# Altium schematic symbol library TI Amplifiers and Linear Operational Amplifier High Speed.SchLib: 1100 symbols (part 23 of 25)
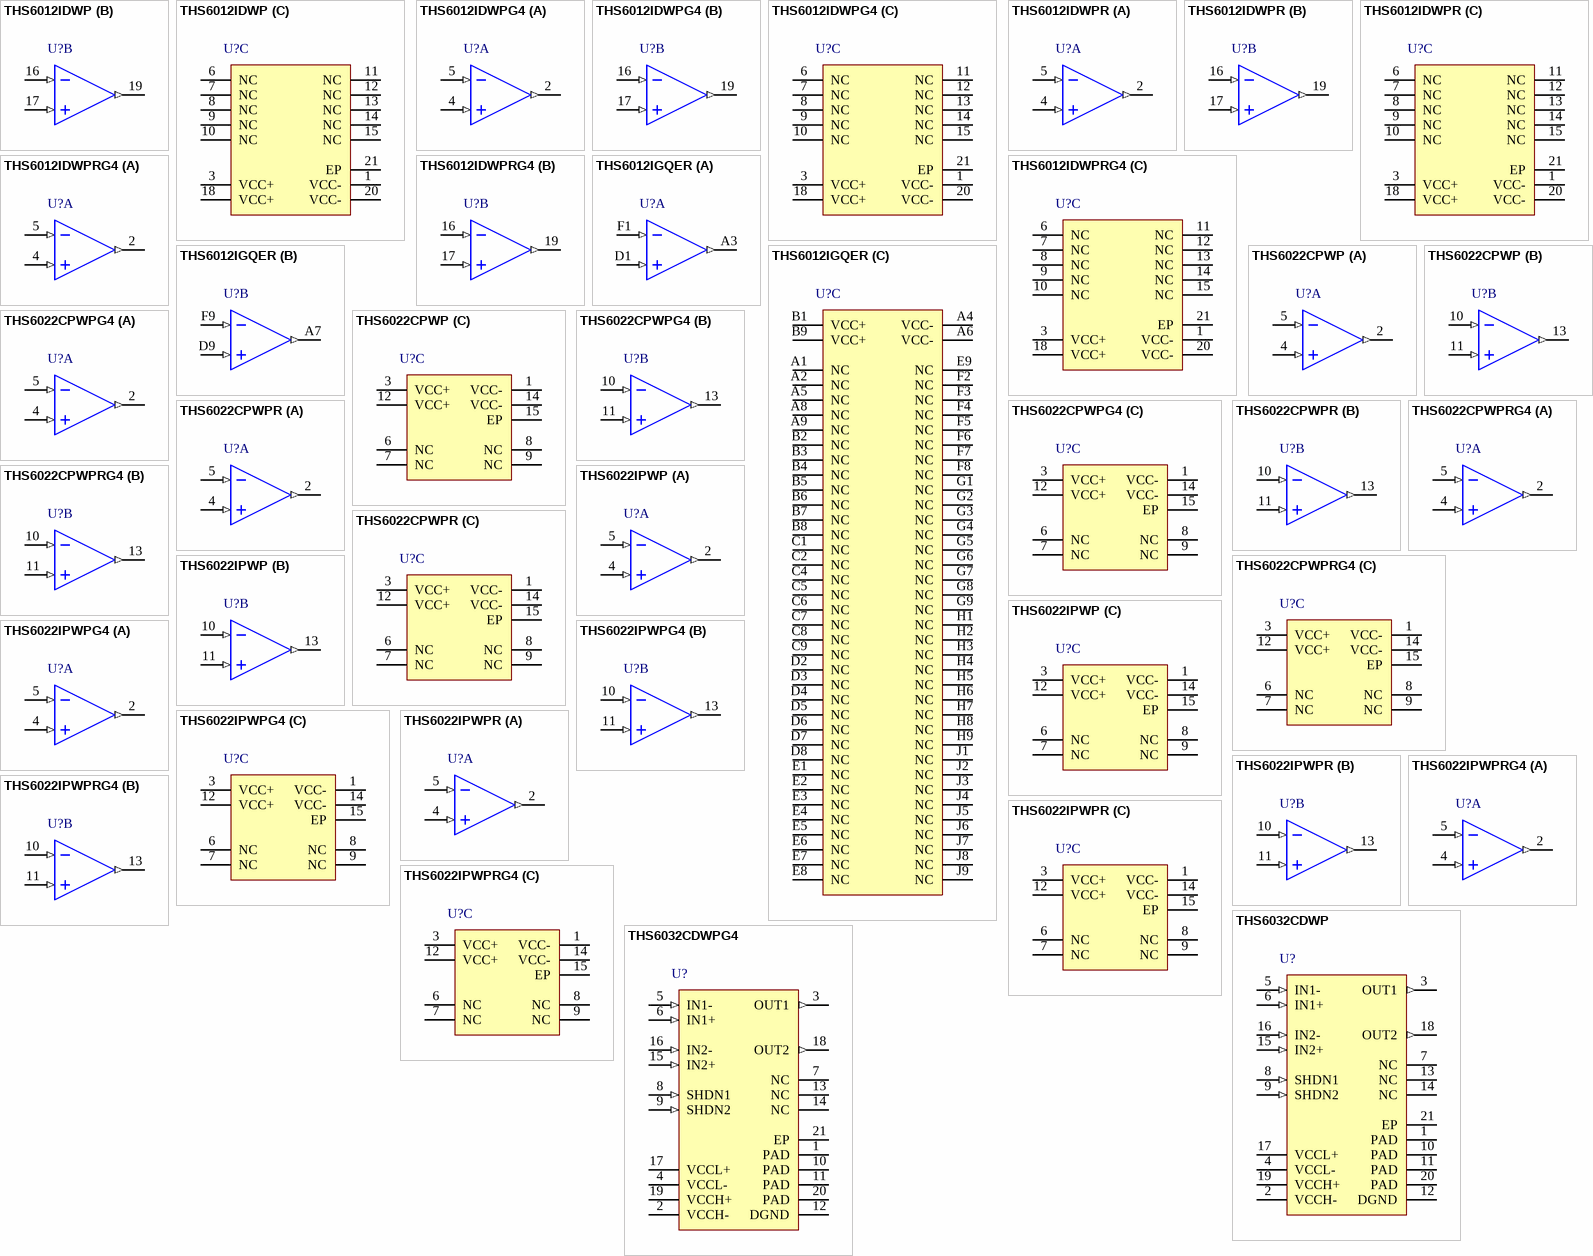
[diagram p73: symbols THS6012IDWP to THS6032CDWPG4]

## THS6022IPWPG4
designator U?
250 mA Dual Differential Line Driver, 9 to 32 V, -40 to 85 degC, 14-pin SOP (PWP14), Green (RoHS & no Sb/Br); Manufacturer: Texas Instruments; PartNumber: THS6022IPWPG4; 2nd Harmonic(dBc): 76; 3rd Harmonic(dBc): 80; @ MHz: 1; BW @ Acl(MHz): 210; Diff Gain(%): 0.04; Diff Phase(deg): 0.06; Iib(Max)(nA): 12000; Io(Typ)(mA): 250; Iq per channel(Max)(mA): 10; Number of Channels: 2; Settling Time (0.1%)(Typ)(ns): 70; Slew Rate(Typ)(V/us): 1900; Sub Family: High Output Current Amplifier (>=50mA), High Speed Amplifier (>=50MHz), High Supply Voltage Amplifier (>=30V); THD (Fc is 1 MHz)(Typ)(dB): -66; Vio(Max)(mV): 4; Vn at Flatband(Typ)(nV/rtHz): 1.7; Vs(Max)(V): 32; Vs(Min)(V): 9; DatasheetVersion: SLOS225D; PackageVersion: 4073225-2/I, 05/2011; PackageReference: PWP14-1830X2055TP; PackageDescription: 14-Pin Plastic Small Outline, Body 4.4 x 5 mm, Pitch 0.65 mm; Supplier 1: Digi-Key; Supplier Part Number 1: THS6022IPWPG4-ND; Supplier 2: Newark; Supplier Part Number 2: 14M2289; Supplier 3: Mouser; Supplier Part Number 3: 595-THS6022IPWPG4; Acl, min stable gain(V/V): 1; Eco-Plan: Green (RoHS & no Sb/Br); Mounting Technology: Surface Mount; Code_JEDEC: MO-153; ComponentLink1Description: Manufacturer URL; ComponentLink1URL: http://www.ti.com/; ComponentLink2Description: Datasheet; ComponentLink2URL: http://www.ti.com/general/docs/lit/getliterature.tsp?genericPartNumber=THS6022&fileType=pdf; ComponentLink3Description: Package Specification; ComponentLink3URL: http://www.ti.com/litv/pdf/mpds373
footprint TI-PWP14-1830X2055TP_N (SOP, 14-Leads, Body 5x4.4mm, Pitch 0.65mm, Thermal Pad 1.830x2.055mm, IPC Medium Density)
footprint TI-PWP14-1830X2055TP_L (SOP, 14-Leads, Body 5x4.4mm, Pitch 0.65mm, Thermal Pad 1.830x2.055mm, IPC High Density)
footprint TI-PWP14-1830X2055TP_M (SOP, 14-Leads, Body 5x4.4mm, Pitch 0.65mm, Thermal Pad 1.830x2.055mm, IPC Low Density)
part A pins: 2 OUT1 (out), 4 IN1+ (in), 5 IN1- (in)
part B pins: 10 IN2- (in), 11 IN2+ (in), 13 OUT2 (out)
part C pins: 1 VCC- (power), 3 VCC+ (power), 6 NC, 7 NC, 8 NC, 9 NC, 12 VCC+ (power), 14 VCC- (power), 15 EP

## THS6022IPWPR
designator U?
250 mA Dual Differential Line Driver, 9 to 32 V, -40 to 85 degC, 14-pin SOP (PWP14), Green (RoHS & no Sb/Br); Manufacturer: Texas Instruments; PartNumber: THS6022IPWPR; 2nd Harmonic(dBc): 76; 3rd Harmonic(dBc): 80; @ MHz: 1; BW @ Acl(MHz): 210; Diff Gain(%): 0.04; Diff Phase(deg): 0.06; Iib(Max)(nA): 12000; Io(Typ)(mA): 250; Iq per channel(Max)(mA): 10; Number of Channels: 2; Settling Time (0.1%)(Typ)(ns): 70; Slew Rate(Typ)(V/us): 1900; Sub Family: High Output Current Amplifier (>=50mA), High Speed Amplifier (>=50MHz), High Supply Voltage Amplifier (>=30V); THD (Fc is 1 MHz)(Typ)(dB): -66; Vio(Max)(mV): 4; Vn at Flatband(Typ)(nV/rtHz): 1.7; Vs(Max)(V): 32; Vs(Min)(V): 9; DatasheetVersion: SLOS225D; PackageVersion: 4073225-2/I, 05/2011; PackageReference: PWP14-1830X2055TP; PackageDescription: 14-Pin Plastic Small Outline, Body 4.4 x 5 mm, Pitch 0.65 mm; Supplier 1: Digi-Key; Supplier Part Number 1: THS6022IPWPR-ND; Supplier 2: Mouser; Supplier Part Number 2: 595-THS6022IPWPR; Acl, min stable gain(V/V): 1; Eco-Plan: Green (RoHS & no Sb/Br); Mounting Technology: Surface Mount; Code_JEDEC: MO-153; ComponentLink1Description: Manufacturer URL; ComponentLink1URL: http://www.ti.com/; ComponentLink2Description: Datasheet; ComponentLink2URL: http://www.ti.com/general/docs/lit/getliterature.tsp?genericPartNumber=THS6022&fileType=pdf; ComponentLink3Description: Package Specification; ComponentLink3URL: http://www.ti.com/litv/pdf/mpds373
footprint TI-PWP14-1830X2055TP_N (SOP, 14-Leads, Body 5x4.4mm, Pitch 0.65mm, Thermal Pad 1.830x2.055mm, IPC Medium Density)
footprint TI-PWP14-1830X2055TP_L (SOP, 14-Leads, Body 5x4.4mm, Pitch 0.65mm, Thermal Pad 1.830x2.055mm, IPC High Density)
footprint TI-PWP14-1830X2055TP_M (SOP, 14-Leads, Body 5x4.4mm, Pitch 0.65mm, Thermal Pad 1.830x2.055mm, IPC Low Density)
part A pins: 2 OUT1 (out), 4 IN1+ (in), 5 IN1- (in)
part B pins: 10 IN2- (in), 11 IN2+ (in), 13 OUT2 (out)
part C pins: 1 VCC- (power), 3 VCC+ (power), 6 NC, 7 NC, 8 NC, 9 NC, 12 VCC+ (power), 14 VCC- (power), 15 EP

## THS6022IPWPRG4
designator U?
250 mA Dual Differential Line Driver, 9 to 32 V, -40 to 85 degC, 14-pin SOP (PWP14), Green (RoHS & no Sb/Br); Manufacturer: Texas Instruments; PartNumber: THS6022IPWPRG4; 2nd Harmonic(dBc): 76; 3rd Harmonic(dBc): 80; @ MHz: 1; BW @ Acl(MHz): 210; Diff Gain(%): 0.04; Diff Phase(deg): 0.06; Iib(Max)(nA): 12000; Io(Typ)(mA): 250; Iq per channel(Max)(mA): 10; Number of Channels: 2; Settling Time (0.1%)(Typ)(ns): 70; Slew Rate(Typ)(V/us): 1900; Sub Family: High Output Current Amplifier (>=50mA), High Speed Amplifier (>=50MHz), High Supply Voltage Amplifier (>=30V); THD (Fc is 1 MHz)(Typ)(dB): -66; Vio(Max)(mV): 4; Vn at Flatband(Typ)(nV/rtHz): 1.7; Vs(Max)(V): 32; Vs(Min)(V): 9; DatasheetVersion: SLOS225D; PackageVersion: 4073225-2/I, 05/2011; PackageReference: PWP14-1830X2055TP; PackageDescription: 14-Pin Plastic Small Outline, Body 4.4 x 5 mm, Pitch 0.65 mm; Supplier 1: Digi-Key; Supplier Part Number 1: THS6022IPWPRG4-ND; Supplier 2: Mouser; Supplier Part Number 2: 595-THS6022IPWPRG4; Acl, min stable gain(V/V): 1; Eco-Plan: Green (RoHS & no Sb/Br); Mounting Technology: Surface Mount; Code_JEDEC: MO-153; ComponentLink1Description: Manufacturer URL; ComponentLink1URL: http://www.ti.com/; ComponentLink2Description: Datasheet; ComponentLink2URL: http://www.ti.com/general/docs/lit/getliterature.tsp?genericPartNumber=THS6022&fileType=pdf; ComponentLink3Description: Package Specification; ComponentLink3URL: http://www.ti.com/litv/pdf/mpds373
footprint TI-PWP14-1830X2055TP_N (SOP, 14-Leads, Body 5x4.4mm, Pitch 0.65mm, Thermal Pad 1.830x2.055mm, IPC Medium Density)
footprint TI-PWP14-1830X2055TP_L (SOP, 14-Leads, Body 5x4.4mm, Pitch 0.65mm, Thermal Pad 1.830x2.055mm, IPC High Density)
footprint TI-PWP14-1830X2055TP_M (SOP, 14-Leads, Body 5x4.4mm, Pitch 0.65mm, Thermal Pad 1.830x2.055mm, IPC Low Density)
part A pins: 2 OUT1 (out), 4 IN1+ (in), 5 IN1- (in)
part B pins: 10 IN2- (in), 11 IN2+ (in), 13 OUT2 (out)
part C pins: 1 VCC- (power), 3 VCC+ (power), 6 NC, 7 NC, 8 NC, 9 NC, 12 VCC+ (power), 14 VCC- (power), 15 EP

## THS6032CDWP
designator U?
Low-Power ADSL Central Office Line Driver, 6 to 32 V, 0 to 70 degC, 20-pin SOP (DWP20), Green (RoHS & no Sb/Br); Manufacturer: Texas Instruments; PartNumber: THS6032CDWP; 2nd Harmonic(dBc): 79; 3rd Harmonic(dBc): 68; @ MHz: 1; BW @ Acl(MHz): 100; Diff Gain(%): 0.016; Diff Phase(deg): 0.4; Iib(Max)(nA): 12000; Io(Typ)(mA): 440; Number of Channels: 2; Settling Time (0.1%)(Typ)(ns): 120; Slew Rate(Typ)(V/us): 1200; Sub Family: High Output Current Amplifier (>=50mA), High Speed Amplifier (>=50MHz), High Supply Voltage Amplifier (>=30V); THD (Fc is 1 MHz)(Typ)(dB): -62; Vio(Max)(mV): 5; Vn at Flatband(Typ)(nV/rtHz): 2.4; Vs(Max)(V): 32; Vs(Min)(V): 6; DatasheetVersion: SLOS233F; PackageVersion: 4147575/C, 02/2005; PackageReference: DWP20-3905X3265TP; PackageDescription: 20-Pin PowerPAD(TM) Plastic Small-Outline Package, Body 12.825 x 7.52 mm, Pitch 1.27 mm; Supplier 1: Digi-Key; Supplier Part Number 1: 296-2373-5-ND; Supplier 2: Newark; Supplier Part Number 2: 76C6521; Supplier 3: Mouser; Supplier Part Number 3: 595-THS6032CDWP; Acl, min stable gain(V/V): 1; Eco-Plan: Green (RoHS & no Sb/Br); Mounting Technology: Surface Mount; ComponentLink1Description: Manufacturer URL; ComponentLink1URL: http://www.ti.com/; ComponentLink2Description: Datasheet; ComponentLink2URL: http://www.ti.com/general/docs/lit/getliterature.tsp?genericPartNumber=THS6032&fileType=pdf; ComponentLink3Description: Package Specification; ComponentLink3URL: http://www.ti.com/litv/pdf/mpds032b
footprint TI-DWP20-3905X3265TP_N (SOP, 20-Leads, Body 12.83x7.52mm, Pitch 1.27mm, Thermal Pad 3.27x3.91mm, IPC Medium Density)
footprint TI-DWP20-3905X3265TP_L (SOP, 20-Leads, Body 12.83x7.52mm, Pitch 1.27mm, Thermal Pad 3.27x3.91mm, IPC High Density)
footprint TI-DWP20-3905X3265TP_M (SOP, 20-Leads, Body 12.83x7.52mm, Pitch 1.27mm, Thermal Pad 3.27x3.91mm, IPC Low Density)
pins: 1 PAD (power), 2 VCCH- (power), 3 OUT1 (out), 4 VCCL- (power), 5 IN1- (in), 6 IN1+ (in), 7 NC, 8 SHDN1 (in), 9 SHDN2 (in), 10 PAD (power), 11 PAD (power), 12 DGND (power), 13 NC, 14 NC, 15 IN2+ (in), 16 IN2- (in), 17 VCCL+ (power), 18 OUT2 (out), 19 VCCH+ (power), 20 PAD (power), 21 EP (power)

## THS6032CDWPG4
designator U?
Low-Power ADSL Central Office Line Driver, 6 to 32 V, 0 to 70 degC, 20-pin SOP (DWP20), Green (RoHS & no Sb/Br); Manufacturer: Texas Instruments; PartNumber: THS6032CDWPG4; 2nd Harmonic(dBc): 79; 3rd Harmonic(dBc): 68; @ MHz: 1; BW @ Acl(MHz): 100; Diff Gain(%): 0.016; Diff Phase(deg): 0.4; Iib(Max)(nA): 12000; Io(Typ)(mA): 440; Number of Channels: 2; Settling Time (0.1%)(Typ)(ns): 120; Slew Rate(Typ)(V/us): 1200; Sub Family: High Output Current Amplifier (>=50mA), High Speed Amplifier (>=50MHz), High Supply Voltage Amplifier (>=30V); THD (Fc is 1 MHz)(Typ)(dB): -62; Vio(Max)(mV): 5; Vn at Flatband(Typ)(nV/rtHz): 2.4; Vs(Max)(V): 32; Vs(Min)(V): 6; DatasheetVersion: SLOS233F; PackageVersion: 4147575/C, 02/2005; PackageReference: DWP20-3905X3265TP; PackageDescription: 20-Pin PowerPAD(TM) Plastic Small-Outline Package, Body 12.825 x 7.52 mm, Pitch 1.27 mm; Supplier 1: Digi-Key; Supplier Part Number 1: THS6032CDWPG4-ND; Supplier 2: Mouser; Supplier Part Number 2: 595-THS6032CDWPG4; Acl, min stable gain(V/V): 1; Eco-Plan: Green (RoHS & no Sb/Br); Mounting Technology: Surface Mount; ComponentLink1Description: Manufacturer URL; ComponentLink1URL: http://www.ti.com/; ComponentLink2Description: Datasheet; ComponentLink2URL: http://www.ti.com/general/docs/lit/getliterature.tsp?genericPartNumber=THS6032&fileType=pdf; ComponentLink3Description: Package Specification; ComponentLink3URL: http://www.ti.com/litv/pdf/mpds032b
footprint TI-DWP20-3905X3265TP_N (SOP, 20-Leads, Body 12.83x7.52mm, Pitch 1.27mm, Thermal Pad 3.27x3.91mm, IPC Medium Density)
footprint TI-DWP20-3905X3265TP_L (SOP, 20-Leads, Body 12.83x7.52mm, Pitch 1.27mm, Thermal Pad 3.27x3.91mm, IPC High Density)
footprint TI-DWP20-3905X3265TP_M (SOP, 20-Leads, Body 12.83x7.52mm, Pitch 1.27mm, Thermal Pad 3.27x3.91mm, IPC Low Density)
pins: 1 PAD (power), 2 VCCH- (power), 3 OUT1 (out), 4 VCCL- (power), 5 IN1- (in), 6 IN1+ (in), 7 NC, 8 SHDN1 (in), 9 SHDN2 (in), 10 PAD (power), 11 PAD (power), 12 DGND (power), 13 NC, 14 NC, 15 IN2+ (in), 16 IN2- (in), 17 VCCL+ (power), 18 OUT2 (out), 19 VCCH+ (power), 20 PAD (power), 21 EP (power)

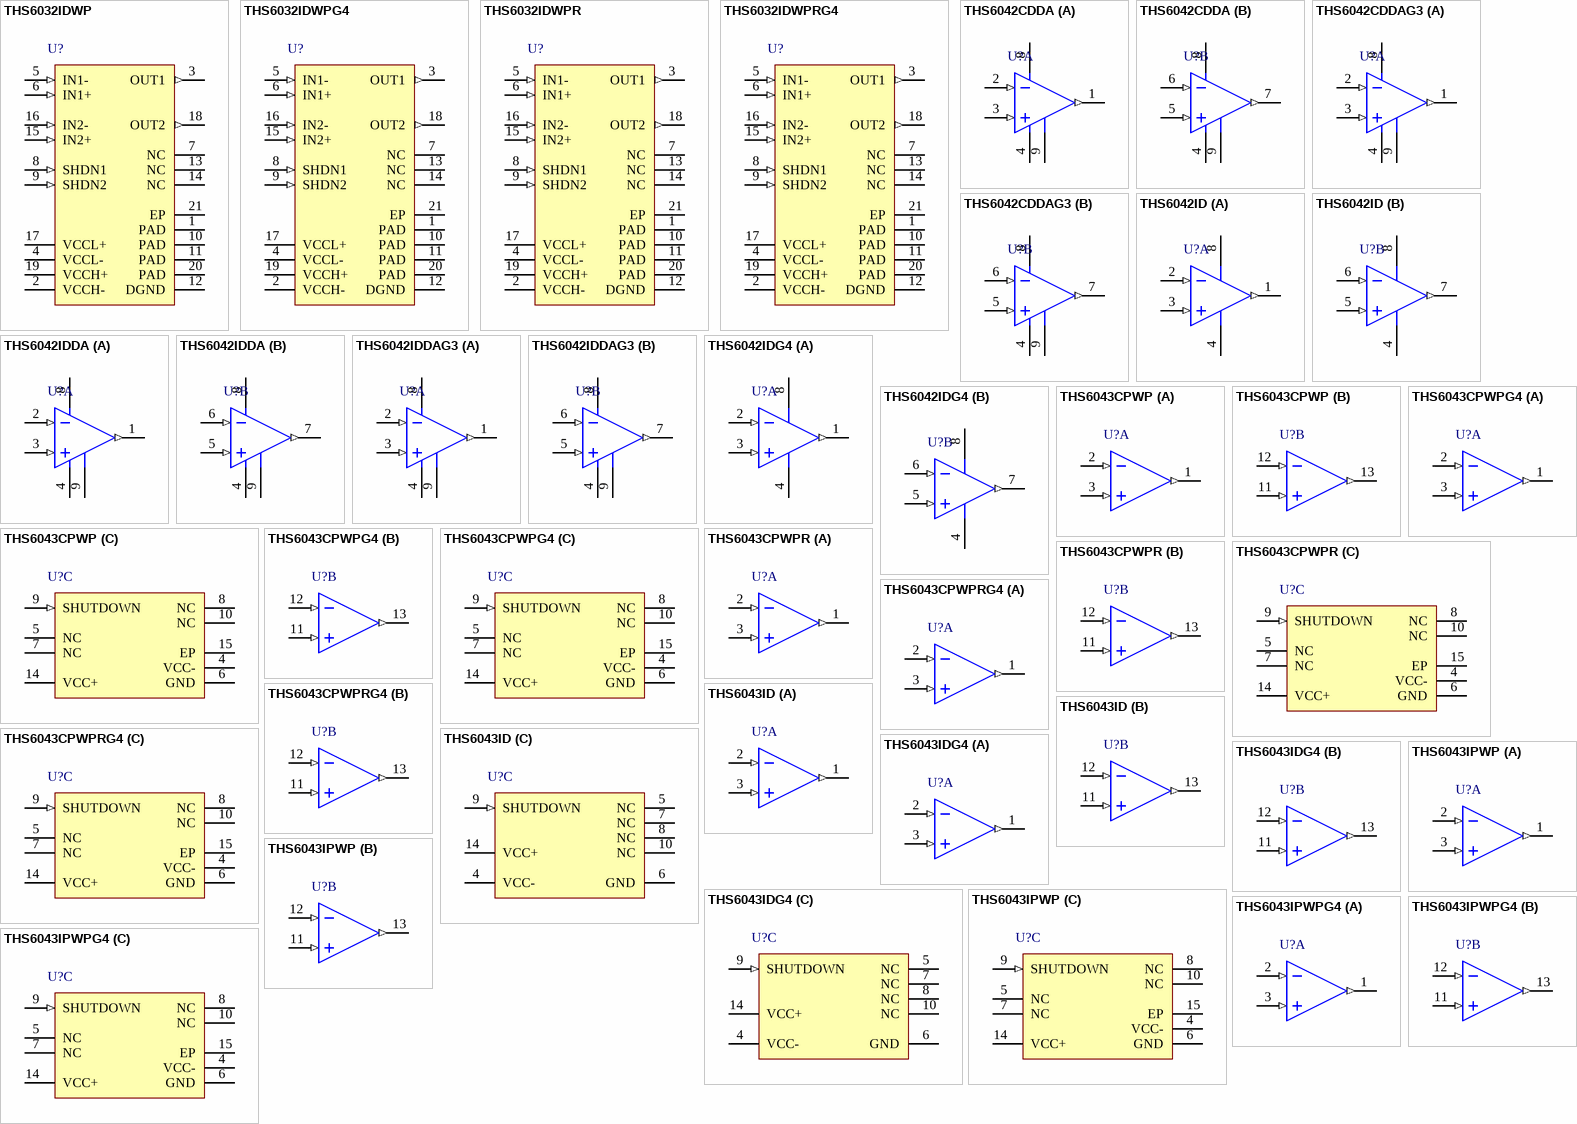
[diagram p46: symbols THS6032IDWP to THS6043IPWPG4]

## THS6032IDWP
designator U?
Low-Power ADSL Central Office Line Driver, 6 to 32 V, -40 to 85 degC, 20-pin SOP (DWP20), Green (RoHS & no Sb/Br); Manufacturer: Texas Instruments; PartNumber: THS6032IDWP; 2nd Harmonic(dBc): 79; 3rd Harmonic(dBc): 68; @ MHz: 1; BW @ Acl(MHz): 100; Diff Gain(%): 0.016; Diff Phase(deg): 0.4; Iib(Max)(nA): 12000; Io(Typ)(mA): 440; Number of Channels: 2; Settling Time (0.1%)(Typ)(ns): 120; Slew Rate(Typ)(V/us): 1200; Sub Family: High Output Current Amplifier (>=50mA), High Speed Amplifier (>=50MHz), High Supply Voltage Amplifier (>=30V); THD (Fc is 1 MHz)(Typ)(dB): -62; Vio(Max)(mV): 5; Vn at Flatband(Typ)(nV/rtHz): 2.4; Vs(Max)(V): 32; Vs(Min)(V): 6; DatasheetVersion: SLOS233F; PackageVersion: 4147575/C, 02/2005; PackageReference: DWP20-3905X3265TP; PackageDescription: 20-Pin PowerPAD(TM) Plastic Small-Outline Package, Body 12.825 x 7.52 mm, Pitch 1.27 mm; Supplier 1: Digi-Key; Supplier Part Number 1: 296-10065-5-ND; Supplier 2: Newark; Supplier Part Number 2: 76C6527; Supplier 3: Mouser; Supplier Part Number 3: 595-THS6032IDWP; Acl, min stable gain(V/V): 1; Eco-Plan: Green (RoHS & no Sb/Br); Mounting Technology: Surface Mount; ComponentLink1Description: Manufacturer URL; ComponentLink1URL: http://www.ti.com/; ComponentLink2Description: Datasheet; ComponentLink2URL: http://www.ti.com/general/docs/lit/getliterature.tsp?genericPartNumber=THS6032&fileType=pdf; ComponentLink3Description: Package Specification; ComponentLink3URL: http://www.ti.com/litv/pdf/mpds032b
footprint TI-DWP20-3905X3265TP_N (SOP, 20-Leads, Body 12.83x7.52mm, Pitch 1.27mm, Thermal Pad 3.27x3.91mm, IPC Medium Density)
footprint TI-DWP20-3905X3265TP_L (SOP, 20-Leads, Body 12.83x7.52mm, Pitch 1.27mm, Thermal Pad 3.27x3.91mm, IPC High Density)
footprint TI-DWP20-3905X3265TP_M (SOP, 20-Leads, Body 12.83x7.52mm, Pitch 1.27mm, Thermal Pad 3.27x3.91mm, IPC Low Density)
pins: 1 PAD (power), 2 VCCH- (power), 3 OUT1 (out), 4 VCCL- (power), 5 IN1- (in), 6 IN1+ (in), 7 NC, 8 SHDN1 (in), 9 SHDN2 (in), 10 PAD (power), 11 PAD (power), 12 DGND (power), 13 NC, 14 NC, 15 IN2+ (in), 16 IN2- (in), 17 VCCL+ (power), 18 OUT2 (out), 19 VCCH+ (power), 20 PAD (power), 21 EP (power)

## THS6032IDWPG4
designator U?
Low-Power ADSL Central Office Line Driver, 6 to 32 V, -40 to 85 degC, 20-pin SOP (DWP20), Green (RoHS & no Sb/Br); Manufacturer: Texas Instruments; PartNumber: THS6032IDWPG4; 2nd Harmonic(dBc): 79; 3rd Harmonic(dBc): 68; @ MHz: 1; BW @ Acl(MHz): 100; Diff Gain(%): 0.016; Diff Phase(deg): 0.4; Iib(Max)(nA): 12000; Io(Typ)(mA): 440; Number of Channels: 2; Settling Time (0.1%)(Typ)(ns): 120; Slew Rate(Typ)(V/us): 1200; Sub Family: High Output Current Amplifier (>=50mA), High Speed Amplifier (>=50MHz), High Supply Voltage Amplifier (>=30V); THD (Fc is 1 MHz)(Typ)(dB): -62; Vio(Max)(mV): 5; Vn at Flatband(Typ)(nV/rtHz): 2.4; Vs(Max)(V): 32; Vs(Min)(V): 6; DatasheetVersion: SLOS233F; PackageVersion: 4147575/C, 02/2005; PackageReference: DWP20-3905X3265TP; PackageDescription: 20-Pin PowerPAD(TM) Plastic Small-Outline Package, Body 12.825 x 7.52 mm, Pitch 1.27 mm; Supplier 1: Digi-Key; Supplier Part Number 1: THS6032IDWPG4-ND; Supplier 2: Mouser; Supplier Part Number 2: 595-THS6032IDWPG4; Acl, min stable gain(V/V): 1; Eco-Plan: Green (RoHS & no Sb/Br); Mounting Technology: Surface Mount; ComponentLink1Description: Manufacturer URL; ComponentLink1URL: http://www.ti.com/; ComponentLink2Description: Datasheet; ComponentLink2URL: http://www.ti.com/general/docs/lit/getliterature.tsp?genericPartNumber=THS6032&fileType=pdf; ComponentLink3Description: Package Specification; ComponentLink3URL: http://www.ti.com/litv/pdf/mpds032b
footprint TI-DWP20-3905X3265TP_N (SOP, 20-Leads, Body 12.83x7.52mm, Pitch 1.27mm, Thermal Pad 3.27x3.91mm, IPC Medium Density)
footprint TI-DWP20-3905X3265TP_L (SOP, 20-Leads, Body 12.83x7.52mm, Pitch 1.27mm, Thermal Pad 3.27x3.91mm, IPC High Density)
footprint TI-DWP20-3905X3265TP_M (SOP, 20-Leads, Body 12.83x7.52mm, Pitch 1.27mm, Thermal Pad 3.27x3.91mm, IPC Low Density)
pins: 1 PAD (power), 2 VCCH- (power), 3 OUT1 (out), 4 VCCL- (power), 5 IN1- (in), 6 IN1+ (in), 7 NC, 8 SHDN1 (in), 9 SHDN2 (in), 10 PAD (power), 11 PAD (power), 12 DGND (power), 13 NC, 14 NC, 15 IN2+ (in), 16 IN2- (in), 17 VCCL+ (power), 18 OUT2 (out), 19 VCCH+ (power), 20 PAD (power), 21 EP (power)

## THS6032IDWPR
designator U?
Low-Power ADSL Central Office Line Driver, 6 to 32 V, -40 to 85 degC, 20-pin SOP (DWP20), Green (RoHS & no Sb/Br); Manufacturer: Texas Instruments; PartNumber: THS6032IDWPR; 2nd Harmonic(dBc): 79; 3rd Harmonic(dBc): 68; @ MHz: 1; BW @ Acl(MHz): 100; Diff Gain(%): 0.016; Diff Phase(deg): 0.4; Iib(Max)(nA): 12000; Io(Typ)(mA): 440; Number of Channels: 2; Settling Time (0.1%)(Typ)(ns): 120; Slew Rate(Typ)(V/us): 1200; Sub Family: High Output Current Amplifier (>=50mA), High Speed Amplifier (>=50MHz), High Supply Voltage Amplifier (>=30V); THD (Fc is 1 MHz)(Typ)(dB): -62; Vio(Max)(mV): 5; Vn at Flatband(Typ)(nV/rtHz): 2.4; Vs(Max)(V): 32; Vs(Min)(V): 6; DatasheetVersion: SLOS233F; PackageVersion: 4147575/C, 02/2005; PackageReference: DWP20-3905X3265TP; PackageDescription: 20-Pin PowerPAD(TM) Plastic Small-Outline Package, Body 12.825 x 7.52 mm, Pitch 1.27 mm; Supplier 1: Digi-Key; Supplier Part Number 1: THS6032IDWPR-ND; Supplier 2: Mouser; Supplier Part Number 2: 595-THS6032IDWPR; Acl, min stable gain(V/V): 1; Eco-Plan: Green (RoHS & no Sb/Br); Mounting Technology: Surface Mount; ComponentLink1Description: Manufacturer URL; ComponentLink1URL: http://www.ti.com/; ComponentLink2Description: Datasheet; ComponentLink2URL: http://www.ti.com/general/docs/lit/getliterature.tsp?genericPartNumber=THS6032&fileType=pdf; ComponentLink3Description: Package Specification; ComponentLink3URL: http://www.ti.com/litv/pdf/mpds032b
footprint TI-DWP20-3905X3265TP_N (SOP, 20-Leads, Body 12.83x7.52mm, Pitch 1.27mm, Thermal Pad 3.27x3.91mm, IPC Medium Density)
footprint TI-DWP20-3905X3265TP_L (SOP, 20-Leads, Body 12.83x7.52mm, Pitch 1.27mm, Thermal Pad 3.27x3.91mm, IPC High Density)
footprint TI-DWP20-3905X3265TP_M (SOP, 20-Leads, Body 12.83x7.52mm, Pitch 1.27mm, Thermal Pad 3.27x3.91mm, IPC Low Density)
pins: 1 PAD (power), 2 VCCH- (power), 3 OUT1 (out), 4 VCCL- (power), 5 IN1- (in), 6 IN1+ (in), 7 NC, 8 SHDN1 (in), 9 SHDN2 (in), 10 PAD (power), 11 PAD (power), 12 DGND (power), 13 NC, 14 NC, 15 IN2+ (in), 16 IN2- (in), 17 VCCL+ (power), 18 OUT2 (out), 19 VCCH+ (power), 20 PAD (power), 21 EP (power)

## THS6032IDWPRG4
designator U?
Low-Power ADSL Central Office Line Driver, 6 to 32 V, -40 to 85 degC, 20-pin SOP (DWP20), Green (RoHS & no Sb/Br); Manufacturer: Texas Instruments; PartNumber: THS6032IDWPRG4; 2nd Harmonic(dBc): 79; 3rd Harmonic(dBc): 68; @ MHz: 1; BW @ Acl(MHz): 100; Diff Gain(%): 0.016; Diff Phase(deg): 0.4; Iib(Max)(nA): 12000; Io(Typ)(mA): 440; Number of Channels: 2; Settling Time (0.1%)(Typ)(ns): 120; Slew Rate(Typ)(V/us): 1200; Sub Family: High Output Current Amplifier (>=50mA), High Speed Amplifier (>=50MHz), High Supply Voltage Amplifier (>=30V); THD (Fc is 1 MHz)(Typ)(dB): -62; Vio(Max)(mV): 5; Vn at Flatband(Typ)(nV/rtHz): 2.4; Vs(Max)(V): 32; Vs(Min)(V): 6; DatasheetVersion: SLOS233F; PackageVersion: 4147575/C, 02/2005; PackageReference: DWP20-3905X3265TP; PackageDescription: 20-Pin PowerPAD(TM) Plastic Small-Outline Package, Body 12.825 x 7.52 mm, Pitch 1.27 mm; Supplier 1: Digi-Key; Supplier Part Number 1: THS6032IDWPRG4-ND; Supplier 2: Newark; Supplier Part Number 2: 61K1748; Supplier 3: Mouser; Supplier Part Number 3: 595-THS6032IDWPRG4; Acl, min stable gain(V/V): 1; Eco-Plan: Green (RoHS & no Sb/Br); Mounting Technology: Surface Mount; ComponentLink1Description: Manufacturer URL; ComponentLink1URL: http://www.ti.com/; ComponentLink2Description: Datasheet; ComponentLink2URL: http://www.ti.com/general/docs/lit/getliterature.tsp?genericPartNumber=THS6032&fileType=pdf; ComponentLink3Description: Package Specification; ComponentLink3URL: http://www.ti.com/litv/pdf/mpds032b
footprint TI-DWP20-3905X3265TP_N (SOP, 20-Leads, Body 12.83x7.52mm, Pitch 1.27mm, Thermal Pad 3.27x3.91mm, IPC Medium Density)
footprint TI-DWP20-3905X3265TP_L (SOP, 20-Leads, Body 12.83x7.52mm, Pitch 1.27mm, Thermal Pad 3.27x3.91mm, IPC High Density)
footprint TI-DWP20-3905X3265TP_M (SOP, 20-Leads, Body 12.83x7.52mm, Pitch 1.27mm, Thermal Pad 3.27x3.91mm, IPC Low Density)
pins: 1 PAD (power), 2 VCCH- (power), 3 OUT1 (out), 4 VCCL- (power), 5 IN1- (in), 6 IN1+ (in), 7 NC, 8 SHDN1 (in), 9 SHDN2 (in), 10 PAD (power), 11 PAD (power), 12 DGND (power), 13 NC, 14 NC, 15 IN2+ (in), 16 IN2- (in), 17 VCCL+ (power), 18 OUT2 (out), 19 VCCH+ (power), 20 PAD (power), 21 EP (power)

## THS6042CDDA
designator U?
350 mA, +/-12 V ADSL CPE Line Driver, 10 to 30 V, 0 to 70 degC, 8-pin SOP (DDA8), Green (RoHS & no Sb/Br); Manufacturer: Texas Instruments; PartNumber: THS6042CDDA; 2nd Harmonic(dBc): 53; 3rd Harmonic(dBc): 70; @ MHz: 5; Acl, min stable gain(V/V): 1; BW @ Acl(MHz): 120; Iib(Max)(nA): 12000; Io(Typ)(mA): 350; Number of Channels: 2; Slew Rate(Typ)(V/us): 1200; Sub Family: High Output Current Amplifier (>=50mA), High Speed Amplifier (>=50MHz), High Supply Voltage Amplifier (>=30V); THD (Fc is 1 MHz)(Typ)(dB): -79; Vio(Max)(mV): 21; Vn at Flatband(Typ)(nV/rtHz): 2.2; Vs(Max)(V): 30; Vs(Min)(V): 10; DatasheetVersion: SLOS264G; PackageVersion: 4202561/F, 12/2011; PackageReference: DDA8-3025X2335TP; PackageDescription: 8-Pin PowerPAD(TM) Plastic Small Outline, Body 4.9 x 3.9 mm, Pitch 1.27 mm; Supplier 1: Digi-Key; Supplier Part Number 1: THS6042CDDA-ND; Supplier 2: Newark; Supplier Part Number 2: 76C6533; Supplier 3: Mouser; Supplier Part Number 3: 595-THS6042CDDA; Eco-Plan: Green (RoHS & no Sb/Br); Mounting Technology: Surface Mount; Code_JEDEC: MS-012; ComponentLink1Description: Manufacturer URL; ComponentLink1URL: http://www.ti.com/; ComponentLink2Description: Datasheet; ComponentLink2URL: http://www.ti.com/general/docs/lit/getliterature.tsp?genericPartNumber=THS6042&fileType=pdf; ComponentLink3Description: Package Specification; ComponentLink3URL: http://www.ti.com/litv/pdf/mpds092e
footprint TI-DDA8-3025X2335TP_N (SOP, 8-Leads, Body 4.9x3.9mm, Pitch 1.27mm, Thermal Pad 3.025x2.335mm, IPC Medium Density)
footprint TI-DDA8-3025X2335TP_L (SOP, 8-Leads, Body 4.9x3.9mm, Pitch 1.27mm, Thermal Pad 3.025x2.335mm, IPC High Density)
footprint TI-DDA8-3025X2335TP_M (SOP, 8-Leads, Body 4.9x3.9mm, Pitch 1.27mm, Thermal Pad 3.025x2.335mm, IPC Low Density)
pins on every part: 4 VCC- (power), 8 VCC+ (power), 9 EP
part A pins: 1 OUT D1 (out), 2 IN D1- (in), 3 IN D1+ (in)
part B pins: 5 IN D2+ (in), 6 IN D2- (in), 7 OUT D2 (out)

## THS6042CDDAG3
designator U?
350 mA, +/-12 V ADSL CPE Line Driver, 10 to 30 V, 0 to 70 degC, 8-pin SOP (DDA8), Green (RoHS & no Sb/Br); Manufacturer: Texas Instruments; PartNumber: THS6042CDDAG3; 2nd Harmonic(dBc): 53; 3rd Harmonic(dBc): 70; @ MHz: 5; Acl, min stable gain(V/V): 1; BW @ Acl(MHz): 120; Iib(Max)(nA): 12000; Io(Typ)(mA): 350; Number of Channels: 2; Slew Rate(Typ)(V/us): 1200; Sub Family: High Output Current Amplifier (>=50mA), High Speed Amplifier (>=50MHz), High Supply Voltage Amplifier (>=30V); THD (Fc is 1 MHz)(Typ)(dB): -79; Vio(Max)(mV): 21; Vn at Flatband(Typ)(nV/rtHz): 2.2; Vs(Max)(V): 30; Vs(Min)(V): 10; DatasheetVersion: SLOS264G; PackageVersion: 4202561/F, 12/2011; PackageReference: DDA8-3025X2335TP; PackageDescription: 8-Pin PowerPAD(TM) Plastic Small Outline, Body 4.9 x 3.9 mm, Pitch 1.27 mm; Supplier 1: Digi-Key; Supplier Part Number 1: THS6042CDDAG3-ND; Supplier 2: Mouser; Supplier Part Number 2: 595-THS6042CDDAG3; Eco-Plan: Green (RoHS & no Sb/Br); Mounting Technology: Surface Mount; Code_JEDEC: MS-012; ComponentLink1Description: Manufacturer URL; ComponentLink1URL: http://www.ti.com/; ComponentLink2Description: Datasheet; ComponentLink2URL: http://www.ti.com/general/docs/lit/getliterature.tsp?genericPartNumber=THS6042&fileType=pdf; ComponentLink3Description: Package Specification; ComponentLink3URL: http://www.ti.com/litv/pdf/mpds092e
footprint TI-DDA8-3025X2335TP_N (SOP, 8-Leads, Body 4.9x3.9mm, Pitch 1.27mm, Thermal Pad 3.025x2.335mm, IPC Medium Density)
footprint TI-DDA8-3025X2335TP_L (SOP, 8-Leads, Body 4.9x3.9mm, Pitch 1.27mm, Thermal Pad 3.025x2.335mm, IPC High Density)
footprint TI-DDA8-3025X2335TP_M (SOP, 8-Leads, Body 4.9x3.9mm, Pitch 1.27mm, Thermal Pad 3.025x2.335mm, IPC Low Density)
pins on every part: 4 VCC- (power), 8 VCC+ (power), 9 EP
part A pins: 1 OUT D1 (out), 2 IN D1- (in), 3 IN D1+ (in)
part B pins: 5 IN D2+ (in), 6 IN D2- (in), 7 OUT D2 (out)

## THS6042ID
designator U?
350 mA, +/-12 V ADSL CPE Line Driver, 10 to 30 V, -40 to 85 degC, 8-pin SOIC (D8), Green (RoHS & no Sb/Br); Manufacturer: Texas Instruments; PartNumber: THS6042ID; 2nd Harmonic(dBc): 53; 3rd Harmonic(dBc): 70; @ MHz: 5; Acl, min stable gain(V/V): 1; BW @ Acl(MHz): 120; Iib(Max)(nA): 12000; Io(Typ)(mA): 350; Number of Channels: 2; Slew Rate(Typ)(V/us): 1200; Sub Family: High Output Current Amplifier (>=50mA), High Speed Amplifier (>=50MHz), High Supply Voltage Amplifier (>=30V); THD (Fc is 1 MHz)(Typ)(dB): -79; Vio(Max)(mV): 21; Vn at Flatband(Typ)(nV/rtHz): 2.2; Vs(Max)(V): 30; Vs(Min)(V): 10; DatasheetVersion: SLOS264G; PackageVersion: 4040047-3/M, 06/2011; PackageReference: D8; PackageDescription: 8-Pin Plastic Small Outline, Body 4.9 x 3.9 mm, Pitch 1.27 mm; Supplier 1: Digi-Key; Supplier Part Number 1: 296-12315-5-ND; Supplier 2: Farnell; Supplier Part Number 2: 1755222; Supplier 3: Newark; Supplier Part Number 3: 76C6536; Supplier 4: Mouser; Supplier Part Number 4: 595-THS6042ID; Eco-Plan: Green (RoHS & no Sb/Br); Mounting Technology: Surface Mount; Code_JEDEC: MS-012; ComponentLink1Description: Manufacturer URL; ComponentLink1URL: http://www.ti.com/; ComponentLink2Description: Datasheet; ComponentLink2URL: http://www.ti.com/general/docs/lit/getliterature.tsp?genericPartNumber=THS6042&fileType=pdf; ComponentLink3Description: Package Specification; ComponentLink3URL: http://www.ti.com/litv/pdf/msoi002j
footprint TI-D8_N (SOIC, 8-Leads, Body 4.9x3.9mm, Pitch 1.27mm, IPC Medium Density)
footprint TI-D8_L (SOIC, 8-Leads, Body 4.9x3.9mm, Pitch 1.27mm, IPC High Density)
footprint TI-D8_M (SOIC, 8-Leads, Body 4.9x3.9mm, Pitch 1.27mm, IPC Low Density)
pins on every part: 4 VCC- (power), 8 VCC+ (power)
part A pins: 1 OUT D1 (out), 2 IN D1- (in), 3 IN D1+ (in)
part B pins: 5 IN D2+ (in), 6 IN D2- (in), 7 OUT D2 (out)

## THS6042IDDA
designator U?
350 mA, +/-12 V ADSL CPE Line Driver, 10 to 30 V, -40 to 85 degC, 8-pin SOP (DDA8), Green (RoHS & no Sb/Br); Manufacturer: Texas Instruments; PartNumber: THS6042IDDA; 2nd Harmonic(dBc): 53; 3rd Harmonic(dBc): 70; @ MHz: 5; Acl, min stable gain(V/V): 1; BW @ Acl(MHz): 120; Iib(Max)(nA): 12000; Io(Typ)(mA): 350; Number of Channels: 2; Slew Rate(Typ)(V/us): 1200; Sub Family: High Output Current Amplifier (>=50mA), High Speed Amplifier (>=50MHz), High Supply Voltage Amplifier (>=30V); THD (Fc is 1 MHz)(Typ)(dB): -79; Vio(Max)(mV): 21; Vn at Flatband(Typ)(nV/rtHz): 2.2; Vs(Max)(V): 30; Vs(Min)(V): 10; DatasheetVersion: SLOS264G; PackageVersion: 4202561/F, 12/2011; PackageReference: DDA8-3025X2335TP; PackageDescription: 8-Pin PowerPAD(TM) Plastic Small Outline, Body 4.9 x 3.9 mm, Pitch 1.27 mm; Supplier 1: Digi-Key; Supplier Part Number 1: 296-12667-5-ND; Supplier 2: Newark; Supplier Part Number 2: 76C6537; Supplier 3: Mouser; Supplier Part Number 3: 595-THS6042IDDA; Eco-Plan: Green (RoHS & no Sb/Br); Mounting Technology: Surface Mount; Code_JEDEC: MS-012; ComponentLink1Description: Manufacturer URL; ComponentLink1URL: http://www.ti.com/; ComponentLink2Description: Datasheet; ComponentLink2URL: http://www.ti.com/general/docs/lit/getliterature.tsp?genericPartNumber=THS6042&fileType=pdf; ComponentLink3Description: Package Specification; ComponentLink3URL: http://www.ti.com/litv/pdf/mpds092e
footprint TI-DDA8-3025X2335TP_N (SOP, 8-Leads, Body 4.9x3.9mm, Pitch 1.27mm, Thermal Pad 3.025x2.335mm, IPC Medium Density)
footprint TI-DDA8-3025X2335TP_L (SOP, 8-Leads, Body 4.9x3.9mm, Pitch 1.27mm, Thermal Pad 3.025x2.335mm, IPC High Density)
footprint TI-DDA8-3025X2335TP_M (SOP, 8-Leads, Body 4.9x3.9mm, Pitch 1.27mm, Thermal Pad 3.025x2.335mm, IPC Low Density)
pins on every part: 4 VCC- (power), 8 VCC+ (power), 9 EP
part A pins: 1 OUT D1 (out), 2 IN D1- (in), 3 IN D1+ (in)
part B pins: 5 IN D2+ (in), 6 IN D2- (in), 7 OUT D2 (out)

## THS6042IDDAG3
designator U?
350 mA, +/-12 V ADSL CPE Line Driver, 10 to 30 V, -40 to 85 degC, 8-pin SOP (DDA8), Green (RoHS & no Sb/Br); Manufacturer: Texas Instruments; PartNumber: THS6042IDDAG3; 2nd Harmonic(dBc): 53; 3rd Harmonic(dBc): 70; @ MHz: 5; Acl, min stable gain(V/V): 1; BW @ Acl(MHz): 120; Iib(Max)(nA): 12000; Io(Typ)(mA): 350; Number of Channels: 2; Slew Rate(Typ)(V/us): 1200; Sub Family: High Output Current Amplifier (>=50mA), High Speed Amplifier (>=50MHz), High Supply Voltage Amplifier (>=30V); THD (Fc is 1 MHz)(Typ)(dB): -79; Vio(Max)(mV): 21; Vn at Flatband(Typ)(nV/rtHz): 2.2; Vs(Max)(V): 30; Vs(Min)(V): 10; DatasheetVersion: SLOS264G; PackageVersion: 4202561/F, 12/2011; PackageReference: DDA8-3025X2335TP; PackageDescription: 8-Pin PowerPAD(TM) Plastic Small Outline, Body 4.9 x 3.9 mm, Pitch 1.27 mm; Supplier 1: Digi-Key; Supplier Part Number 1: THS6042IDDAG3-ND; Supplier 2: Newark; Supplier Part Number 2: 18M3155; Supplier 3: Mouser; Supplier Part Number 3: 595-THS6042IDDAG3; Eco-Plan: Green (RoHS & no Sb/Br); Mounting Technology: Surface Mount; Code_JEDEC: MS-012; ComponentLink1Description: Manufacturer URL; ComponentLink1URL: http://www.ti.com/; ComponentLink2Description: Datasheet; ComponentLink2URL: http://www.ti.com/general/docs/lit/getliterature.tsp?genericPartNumber=THS6042&fileType=pdf; ComponentLink3Description: Package Specification; ComponentLink3URL: http://www.ti.com/litv/pdf/mpds092e
footprint TI-DDA8-3025X2335TP_N (SOP, 8-Leads, Body 4.9x3.9mm, Pitch 1.27mm, Thermal Pad 3.025x2.335mm, IPC Medium Density)
footprint TI-DDA8-3025X2335TP_L (SOP, 8-Leads, Body 4.9x3.9mm, Pitch 1.27mm, Thermal Pad 3.025x2.335mm, IPC High Density)
footprint TI-DDA8-3025X2335TP_M (SOP, 8-Leads, Body 4.9x3.9mm, Pitch 1.27mm, Thermal Pad 3.025x2.335mm, IPC Low Density)
pins on every part: 4 VCC- (power), 8 VCC+ (power), 9 EP
part A pins: 1 OUT D1 (out), 2 IN D1- (in), 3 IN D1+ (in)
part B pins: 5 IN D2+ (in), 6 IN D2- (in), 7 OUT D2 (out)

## THS6042IDG4
designator U?
350 mA, +/-12 V ADSL CPE Line Driver, 10 to 30 V, -40 to 85 degC, 8-pin SOIC (D8), Green (RoHS & no Sb/Br); Manufacturer: Texas Instruments; PartNumber: THS6042IDG4; 2nd Harmonic(dBc): 53; 3rd Harmonic(dBc): 70; @ MHz: 5; Acl, min stable gain(V/V): 1; BW @ Acl(MHz): 120; Iib(Max)(nA): 10000; Io(Typ)(mA): 350; Iq per channel(Max)(mA): 11; Number of Channels: 2; Slew Rate(Typ)(V/us): 1200; Sub Family: High Output Current Amplifier (>=50mA), High Speed Amplifier (>=50MHz), High Supply Voltage Amplifier (>=30V); THD (Fc is 1 MHz)(Typ)(dB): -79; Vio(Max)(mV): 16; Vn at Flatband(Typ)(nV/rtHz): 2.2; Vs(Max)(V): 30; Vs(Min)(V): 10; DatasheetVersion: SLOS264G; PackageVersion: 4040047-3/M, 06/2011; PackageReference: D8; PackageDescription: 8-Pin Plastic Small Outline, Body 4.9 x 3.9 mm, Pitch 1.27 mm; Supplier 1: Digi-Key; Supplier Part Number 1: THS6042IDG4-ND; Supplier 2: Mouser; Supplier Part Number 2: 595-THS6042IDG4; Eco-Plan: Green (RoHS & no Sb/Br); Mounting Technology: Surface Mount; Code_JEDEC: MS-012; ComponentLink1Description: Manufacturer URL; ComponentLink1URL: http://www.ti.com/; ComponentLink2Description: Datasheet; ComponentLink2URL: http://www.ti.com/general/docs/lit/getliterature.tsp?genericPartNumber=THS6042&fileType=pdf; ComponentLink3Description: Package Specification; ComponentLink3URL: http://www.ti.com/litv/pdf/msoi002j
footprint TI-D8_N (SOIC, 8-Leads, Body 4.9x3.9mm, Pitch 1.27mm, IPC Medium Density)
footprint TI-D8_L (SOIC, 8-Leads, Body 4.9x3.9mm, Pitch 1.27mm, IPC High Density)
footprint TI-D8_M (SOIC, 8-Leads, Body 4.9x3.9mm, Pitch 1.27mm, IPC Low Density)
pins on every part: 4 VCC- (power), 8 VCC+ (power)
part A pins: 1 OUT D1 (out), 2 IN D1- (in), 3 IN D1+ (in)
part B pins: 5 IN D2+ (in), 6 IN D2- (in), 7 OUT D2 (out)

## THS6043CPWP
designator U?
350 mA, +/-12 V ADSL CPE Line Driver with Shutdown, 10 to 30 V, 0 to 70 degC, 14-pin SOP (PWP14), Green (RoHS & no Sb/Br); Manufacturer: Texas Instruments; PartNumber: THS6043CPWP; 2nd Harmonic(dBc): 53; 3rd Harmonic(dBc): 70; @ MHz: 5; Acl, min stable gain(V/V): 1; BW @ Acl(MHz): 120; Iib(Max)(nA): 12000; Io(Typ)(mA): 350; Number of Channels: 2; Slew Rate(Typ)(V/us): 1200; Sub Family: High Output Current Amplifier (>=50mA), High Speed Amplifier (>=50MHz), High Supply Voltage Amplifier (>=30V); THD (Fc is 1 MHz)(Typ)(dB): -79; Vio(Max)(mV): 21; Vn at Flatband(Typ)(nV/rtHz): 2.2; Vs(Max)(V): 30; Vs(Min)(V): 10; DatasheetVersion: SLOS264G; PackageVersion: 4073225-2/I, 05/2011; PackageReference: PWP14-1830X2055TP; PackageDescription: 14-Pin Plastic Small Outline, Body 4.4 x 5 mm, Pitch 0.65 mm; Supplier 1: Digi-Key; Supplier Part Number 1: 296-34231-5-ND; Supplier 2: Newark; Supplier Part Number 2: 76C6542; Supplier 3: Mouser; Supplier Part Number 3: 595-THS6043CPWP; Eco-Plan: Green (RoHS & no Sb/Br); Mounting Technology: Surface Mount; Code_JEDEC: MO-153; ComponentLink1Description: Manufacturer URL; ComponentLink1URL: http://www.ti.com/; ComponentLink2Description: Datasheet; ComponentLink2URL: http://www.ti.com/general/docs/lit/getliterature.tsp?genericPartNumber=THS6043&fileType=pdf; ComponentLink3Description: Package Specification; ComponentLink3URL: http://www.ti.com/litv/pdf/mpds373
footprint TI-PWP14-1830X2055TP_N (SOP, 14-Leads, Body 5x4.4mm, Pitch 0.65mm, Thermal Pad 1.830x2.055mm, IPC Medium Density)
footprint TI-PWP14-1830X2055TP_L (SOP, 14-Leads, Body 5x4.4mm, Pitch 0.65mm, Thermal Pad 1.830x2.055mm, IPC High Density)
footprint TI-PWP14-1830X2055TP_M (SOP, 14-Leads, Body 5x4.4mm, Pitch 0.65mm, Thermal Pad 1.830x2.055mm, IPC Low Density)
part A pins: 1 OUT D1 (out), 2 IN D1- (in), 3 IN D1+ (in)
part B pins: 11 IN D2+ (in), 12 IN D2- (in), 13 OUT D2 (out)
part C pins: 4 VCC- (power), 5 NC, 6 GND (power), 7 NC, 8 NC, 9 SHUTDOWN (in), 10 NC, 14 VCC+ (power), 15 EP

## THS6043CPWPG4
designator U?
350 mA, +/-12 V ADSL CPE Line Driver with Shutdown, 10 to 30 V, 0 to 70 degC, 14-pin SOP (PWP14), Green (RoHS & no Sb/Br); Manufacturer: Texas Instruments; PartNumber: THS6043CPWPG4; 2nd Harmonic(dBc): 53; 3rd Harmonic(dBc): 70; @ MHz: 5; Acl, min stable gain(V/V): 1; BW @ Acl(MHz): 120; Iib(Max)(nA): 12000; Io(Typ)(mA): 350; Number of Channels: 2; Slew Rate(Typ)(V/us): 1200; Sub Family: High Output Current Amplifier (>=50mA), High Speed Amplifier (>=50MHz), High Supply Voltage Amplifier (>=30V); THD (Fc is 1 MHz)(Typ)(dB): -79; Vio(Max)(mV): 21; Vn at Flatband(Typ)(nV/rtHz): 2.2; Vs(Max)(V): 30; Vs(Min)(V): 10; DatasheetVersion: SLOS264G; PackageVersion: 4073225-2/I, 05/2011; PackageReference: PWP14-1830X2055TP; PackageDescription: 14-Pin Plastic Small Outline, Body 4.4 x 5 mm, Pitch 0.65 mm; Supplier 1: Digi-Key; Supplier Part Number 1: THS6043CPWPG4-ND; Supplier 2: Mouser; Supplier Part Number 2: 595-THS6043CPWPG4; Eco-Plan: Green (RoHS & no Sb/Br); Mounting Technology: Surface Mount; Code_JEDEC: MO-153; ComponentLink1Description: Manufacturer URL; ComponentLink1URL: http://www.ti.com/; ComponentLink2Description: Datasheet; ComponentLink2URL: http://www.ti.com/general/docs/lit/getliterature.tsp?genericPartNumber=THS6043&fileType=pdf; ComponentLink3Description: Package Specification; ComponentLink3URL: http://www.ti.com/litv/pdf/mpds373
footprint TI-PWP14-1830X2055TP_N (SOP, 14-Leads, Body 5x4.4mm, Pitch 0.65mm, Thermal Pad 1.830x2.055mm, IPC Medium Density)
footprint TI-PWP14-1830X2055TP_L (SOP, 14-Leads, Body 5x4.4mm, Pitch 0.65mm, Thermal Pad 1.830x2.055mm, IPC High Density)
footprint TI-PWP14-1830X2055TP_M (SOP, 14-Leads, Body 5x4.4mm, Pitch 0.65mm, Thermal Pad 1.830x2.055mm, IPC Low Density)
part A pins: 1 OUT D1 (out), 2 IN D1- (in), 3 IN D1+ (in)
part B pins: 11 IN D2+ (in), 12 IN D2- (in), 13 OUT D2 (out)
part C pins: 4 VCC- (power), 5 NC, 6 GND (power), 7 NC, 8 NC, 9 SHUTDOWN (in), 10 NC, 14 VCC+ (power), 15 EP

## THS6043CPWPR
designator U?
350 mA, +/-12 V ADSL CPE Line Driver with Shutdown, 10 to 30 V, 0 to 70 degC, 14-pin SOP (PWP14), Green (RoHS & no Sb/Br); Manufacturer: Texas Instruments; PartNumber: THS6043CPWPR; 2nd Harmonic(dBc): 53; 3rd Harmonic(dBc): 70; @ MHz: 5; Acl, min stable gain(V/V): 1; BW @ Acl(MHz): 120; Iib(Max)(nA): 12000; Io(Typ)(mA): 350; Number of Channels: 2; Slew Rate(Typ)(V/us): 1200; Sub Family: High Output Current Amplifier (>=50mA), High Speed Amplifier (>=50MHz), High Supply Voltage Amplifier (>=30V); THD (Fc is 1 MHz)(Typ)(dB): -79; Vio(Max)(mV): 21; Vn at Flatband(Typ)(nV/rtHz): 2.2; Vs(Max)(V): 30; Vs(Min)(V): 10; DatasheetVersion: SLOS264G; PackageVersion: 4073225-2/I, 05/2011; PackageReference: PWP14-1830X2055TP; PackageDescription: 14-Pin Plastic Small Outline, Body 4.4 x 5 mm, Pitch 0.65 mm; Supplier 1: Digi-Key; Supplier Part Number 1: THS6043CPWPR-ND; Supplier 2: Mouser; Supplier Part Number 2: 595-THS6043CPWPR; Eco-Plan: Green (RoHS & no Sb/Br); Mounting Technology: Surface Mount; Code_JEDEC: MO-153; ComponentLink1Description: Manufacturer URL; ComponentLink1URL: http://www.ti.com/; ComponentLink2Description: Datasheet; ComponentLink2URL: http://www.ti.com/general/docs/lit/getliterature.tsp?genericPartNumber=THS6043&fileType=pdf; ComponentLink3Description: Package Specification; ComponentLink3URL: http://www.ti.com/litv/pdf/mpds373
footprint TI-PWP14-1830X2055TP_N (SOP, 14-Leads, Body 5x4.4mm, Pitch 0.65mm, Thermal Pad 1.830x2.055mm, IPC Medium Density)
footprint TI-PWP14-1830X2055TP_L (SOP, 14-Leads, Body 5x4.4mm, Pitch 0.65mm, Thermal Pad 1.830x2.055mm, IPC High Density)
footprint TI-PWP14-1830X2055TP_M (SOP, 14-Leads, Body 5x4.4mm, Pitch 0.65mm, Thermal Pad 1.830x2.055mm, IPC Low Density)
part A pins: 1 OUT D1 (out), 2 IN D1- (in), 3 IN D1+ (in)
part B pins: 11 IN D2+ (in), 12 IN D2- (in), 13 OUT D2 (out)
part C pins: 4 VCC- (power), 5 NC, 6 GND (power), 7 NC, 8 NC, 9 SHUTDOWN (in), 10 NC, 14 VCC+ (power), 15 EP

## THS6043CPWPRG4
designator U?
350 mA, +/-12 V ADSL CPE Line Driver with Shutdown, 10 to 30 V, 0 to 70 degC, 14-pin SOP (PWP14), Green (RoHS & no Sb/Br); Manufacturer: Texas Instruments; PartNumber: THS6043CPWPRG4; 2nd Harmonic(dBc): 53; 3rd Harmonic(dBc): 70; @ MHz: 5; Acl, min stable gain(V/V): 1; BW @ Acl(MHz): 120; Iib(Max)(nA): 12000; Io(Typ)(mA): 350; Number of Channels: 2; Slew Rate(Typ)(V/us): 1200; Sub Family: High Output Current Amplifier (>=50mA), High Speed Amplifier (>=50MHz), High Supply Voltage Amplifier (>=30V); THD (Fc is 1 MHz)(Typ)(dB): -79; Vio(Max)(mV): 21; Vn at Flatband(Typ)(nV/rtHz): 2.2; Vs(Max)(V): 30; Vs(Min)(V): 10; DatasheetVersion: SLOS264G; PackageVersion: 4073225-2/I, 05/2011; PackageReference: PWP14-1830X2055TP; PackageDescription: 14-Pin Plastic Small Outline, Body 4.4 x 5 mm, Pitch 0.65 mm; Supplier 1: Digi-Key; Supplier Part Number 1: THS6043CPWPRG4-ND; Supplier 2: Mouser; Supplier Part Number 2: 595-THS6043CPWPRG4; Eco-Plan: Green (RoHS & no Sb/Br); Mounting Technology: Surface Mount; Code_JEDEC: MO-153; ComponentLink1Description: Manufacturer URL; ComponentLink1URL: http://www.ti.com/; ComponentLink2Description: Datasheet; ComponentLink2URL: http://www.ti.com/general/docs/lit/getliterature.tsp?genericPartNumber=THS6043&fileType=pdf; ComponentLink3Description: Package Specification; ComponentLink3URL: http://www.ti.com/litv/pdf/mpds373
footprint TI-PWP14-1830X2055TP_N (SOP, 14-Leads, Body 5x4.4mm, Pitch 0.65mm, Thermal Pad 1.830x2.055mm, IPC Medium Density)
footprint TI-PWP14-1830X2055TP_L (SOP, 14-Leads, Body 5x4.4mm, Pitch 0.65mm, Thermal Pad 1.830x2.055mm, IPC High Density)
footprint TI-PWP14-1830X2055TP_M (SOP, 14-Leads, Body 5x4.4mm, Pitch 0.65mm, Thermal Pad 1.830x2.055mm, IPC Low Density)
part A pins: 1 OUT D1 (out), 2 IN D1- (in), 3 IN D1+ (in)
part B pins: 11 IN D2+ (in), 12 IN D2- (in), 13 OUT D2 (out)
part C pins: 4 VCC- (power), 5 NC, 6 GND (power), 7 NC, 8 NC, 9 SHUTDOWN (in), 10 NC, 14 VCC+ (power), 15 EP
